# Altium schematic symbol library jlcpcb_2025_04_capacitors_extended_0603.schlib: 3668 symbols (part 14 of 20) (continued)
## EMK107B7473KA-T (continued)

## EMK107B7474KAHT
designator C?  Capacitance: 470nF  (hidden comment: *)
Capacitor, Ceramic (MLCC), 470nF, ±10%, 16V, X7R, ±10%, SMD 0603; Manufacturer: Taiyo Yuden; Manufacturer Part Number: EMK107B7474KAHT; Package Size: 0603; JLCPCB Basic Part: No; JLCPCB Part Number: C385895; Supplier 1: LCSC; Category: Capacitors - MLCC; Supplier Part Number 1: C385895; Tolerance: ±10%; Voltage Rating: 16V; Temperature Coefficient: X7R; RoHS: Yes; ComponentLink1Description: Datasheet; ComponentLink1URL: https://wmsc.lcsc.com/wmsc/upload/file/pdf/v2/lcsc/1912111437_Taiyo-Yuden-EMK107B7474KAHT_C385895.pdf; ComponentLink2Description: JLCPCB Part URL; ComponentLink2URL: https://jlcpcb.com/partdetail/C385895; ComponentLink3Description: LCSC Part URL; ComponentLink3URL: https://lcsc.com/product-detail/Multilayer-Ceramic-Capacitors-MLCC---SMD-SMT_Taiyo-Yuden-Taiyo-Yuden-EMK107B7474KAHT_C385895.html
footprint CAP-0603 (0603 (1608M) Capacitor)
pins: 1, 2

## EMK107BB7225KA-T
designator C?  Capacitance: 2.2uF  (hidden comment: *)
Capacitor, Ceramic (MLCC), 2.2uF, ±10%, 16V, X7R, ±10%, SMD 0603; Manufacturer: Taiyo Yuden; Manufacturer Part Number: EMK107BB7225KA-T; Package Size: 0603; JLCPCB Basic Part: No; JLCPCB Part Number: C337443; Supplier 1: LCSC; Category: Capacitors - MLCC; Supplier Part Number 1: C337443; Tolerance: ±10%; Voltage Rating: 16V; Temperature Coefficient: X7R; RoHS: Yes; ComponentLink1Description: Datasheet; ComponentLink1URL: https://wmsc.lcsc.com/wmsc/upload/file/pdf/v2/lcsc/2304140030_Taiyo-Yuden-EMK107BB7225KA-T_C337443.pdf; ComponentLink2Description: JLCPCB Part URL; ComponentLink2URL: https://jlcpcb.com/partdetail/C337443; ComponentLink3Description: LCSC Part URL; ComponentLink3URL: https://lcsc.com/product-detail/Multilayer-Ceramic-Capacitors-MLCC---SMD-SMT_Taiyo-Yuden-Taiyo-Yuden-EMK107BB7225KA-T_C337443.html
footprint CAP-0603 (0603 (1608M) Capacitor)
pins: 1, 2

## EMK107BBJ475KAHT
designator C?  Capacitance: 4.7uF  (hidden comment: *)
Capacitor, Ceramic (MLCC), 4.7uF, ±10%, 16V, X5R, ±10%, SMD 0603; Manufacturer: Taiyo Yuden; Manufacturer Part Number: EMK107BBJ475KAHT; Package Size: 0603; JLCPCB Basic Part: No; JLCPCB Part Number: C650952; Supplier 1: LCSC; Category: Capacitors - MLCC; Supplier Part Number 1: C650952; Tolerance: ±10%; Voltage Rating: 16V; Temperature Coefficient: X5R; RoHS: Yes; ComponentLink1Description: Datasheet; ComponentLink1URL: https://wmsc.lcsc.com/wmsc/upload/file/pdf/v2/lcsc/2211282200_Taiyo-Yuden-EMK107BBJ475KAHT_C650952.pdf; ComponentLink2Description: JLCPCB Part URL; ComponentLink2URL: https://jlcpcb.com/partdetail/C650952; ComponentLink3Description: LCSC Part URL; ComponentLink3URL: https://lcsc.com/product-detail/Multilayer-Ceramic-Capacitors-MLCC---SMD-SMT_Taiyo-Yuden-Taiyo-Yuden-EMK107BBJ475KAHT_C650952.html
footprint CAP-0603 (0603 (1608M) Capacitor)
pins: 1, 2

## EMK107BJ105KA-T
designator C?  Capacitance: 1uF  (hidden comment: *)
Capacitor, Ceramic (MLCC), 1uF, ±10%, 16V, X5R, ±10%, SMD 0603; Manufacturer: Taiyo Yuden; Manufacturer Part Number: EMK107BJ105KA-T; Package Size: 0603; JLCPCB Basic Part: No; JLCPCB Part Number: C87149; Supplier 1: LCSC; Category: Capacitors - MLCC; Supplier Part Number 1: C87149; Tolerance: ±10%; Voltage Rating: 16V; Temperature Coefficient: X5R; RoHS: Yes; ComponentLink1Description: Datasheet; ComponentLink1URL: https://wmsc.lcsc.com/wmsc/upload/file/pdf/v2/lcsc/2304140030_Taiyo-Yuden-EMK107BJ105KA-T_C87149.pdf; ComponentLink2Description: JLCPCB Part URL; ComponentLink2URL: https://jlcpcb.com/partdetail/C87149; ComponentLink3Description: LCSC Part URL; ComponentLink3URL: https://lcsc.com/product-detail/Multilayer-Ceramic-Capacitors-MLCC---SMD-SMT_Taiyo-Yuden-Taiyo-Yuden-EMK107BJ105KA-T_C87149.html
footprint CAP-0603 (0603 (1608M) Capacitor)
pins: 1, 2

## EMK107BJ225KA-T
designator C?  Capacitance: 2.2uF  (hidden comment: *)
Capacitor, Ceramic (MLCC), 2.2uF, ±10%, 16V, X5R, ±10%, SMD 0603; Manufacturer: Taiyo Yuden; Manufacturer Part Number: EMK107BJ225KA-T; Package Size: 0603; JLCPCB Basic Part: No; JLCPCB Part Number: C92760; Supplier 1: LCSC; Category: Capacitors - MLCC; Supplier Part Number 1: C92760; Tolerance: ±10%; Voltage Rating: 16V; Temperature Coefficient: X5R; RoHS: Yes; ComponentLink1Description: Datasheet; ComponentLink1URL: https://wmsc.lcsc.com/wmsc/upload/file/pdf/v2/lcsc/1810171733_Taiyo-Yuden-EMK107BJ225KA-T_C92760.pdf; ComponentLink2Description: JLCPCB Part URL; ComponentLink2URL: https://jlcpcb.com/partdetail/C92760; ComponentLink3Description: LCSC Part URL; ComponentLink3URL: https://lcsc.com/product-detail/Multilayer-Ceramic-Capacitors-MLCC---SMD-SMT_Taiyo-Yuden-Taiyo-Yuden-EMK107BJ225KA-T_C92760.html
footprint CAP-0603 (0603 (1608M) Capacitor)
pins: 1, 2

## EMK107SD103KA-T
designator C?  Capacitance: 10nF  (hidden comment: *)
Capacitor, Ceramic (MLCC), 10nF, ±10%, 16V, ±10%, SMD 0603; Manufacturer: Taiyo Yuden; Manufacturer Part Number: EMK107SD103KA-T; Package Size: 0603; JLCPCB Basic Part: No; JLCPCB Part Number: C524961; Supplier 1: LCSC; Category: Capacitors - MLCC; Supplier Part Number 1: C524961; Tolerance: ±10%; Voltage Rating: 16V; RoHS: Yes; ComponentLink1Description: Datasheet; ComponentLink1URL: https://wmsc.lcsc.com/wmsc/upload/file/pdf/v2/lcsc/2211282200_Taiyo-Yuden-EMK107SD103KA-T_C524961.pdf; ComponentLink2Description: JLCPCB Part URL; ComponentLink2URL: https://jlcpcb.com/partdetail/C524961; ComponentLink3Description: LCSC Part URL; ComponentLink3URL: https://lcsc.com/product-detail/Multilayer-Ceramic-Capacitors-MLCC---SMD-SMT_Taiyo-Yuden-Taiyo-Yuden-EMK107SD103KA-T_C524961.html
footprint CAP-0603 (0603 (1608M) Capacitor)
pins: 1, 2

## ESD31C103K4T2A-18
designator C?  Capacitance: 10nF  (hidden comment: *)
Capacitor, Ceramic (MLCC), 10nF, ±10%, 100V, X7R, ±10%, SMD 0603; Manufacturer: Kyocera AVX; Manufacturer Part Number: ESD31C103K4T2A-18; Package Size: 0603; JLCPCB Basic Part: No; JLCPCB Part Number: C779983; Supplier 1: LCSC; Category: Capacitors - MLCC; Supplier Part Number 1: C779983; Tolerance: ±10%; Voltage Rating: 100V; Temperature Coefficient: X7R; RoHS: Yes; ComponentLink1Description: Datasheet; ComponentLink1URL: https://wmsc.lcsc.com/wmsc/upload/file/pdf/v2/lcsc/2304140030_Kyocera-AVX-ESD31C103K4T2A-18_C779983.pdf; ComponentLink2Description: JLCPCB Part URL; ComponentLink2URL: https://jlcpcb.com/partdetail/C779983; ComponentLink3Description: LCSC Part URL; ComponentLink3URL: https://lcsc.com/product-detail/Multilayer-Ceramic-Capacitors-MLCC---SMD-SMT_Kyocera-AVX-Kyocera-AVX-ESD31C103K4T2A-18_C779983.html
footprint CAP-0603 (0603 (1608M) Capacitor)
pins: 1, 2

## FCC0603B104K101CT
designator C?  Capacitance: 100000pF  (hidden comment: *)
Capacitor, Ceramic (MLCC), 100000pF, ±10%, 100V, X7R, ±10%, SMD 0603; Manufacturer: FOJAN; Manufacturer Part Number: FCC0603B104K101CT; Package Size: 0603; JLCPCB Basic Part: No; JLCPCB Part Number: C5137616; Supplier 1: LCSC; Category: Capacitors - MLCC; Supplier Part Number 1: C5137616; Tolerance: ±10%; Voltage Rating: 100V; Temperature Coefficient: X7R; RoHS: Yes; ComponentLink1Description: Datasheet; ComponentLink1URL: https://wmsc.lcsc.com/wmsc/upload/file/pdf/v2/lcsc/2208181800_FOJAN-FCC0603B104K101CT_C5137616.pdf; ComponentLink2Description: JLCPCB Part URL; ComponentLink2URL: https://jlcpcb.com/partdetail/C5137616; ComponentLink3Description: LCSC Part URL; ComponentLink3URL: https://lcsc.com/product-detail/Multilayer-Ceramic-Capacitors-MLCC---SMD-SMT_FOJAN-FOJAN-FCC0603B104K101CT_C5137616.html
footprint CAP-0603 (0603 (1608M) Capacitor)
pins: 1, 2

## FCC0603B203K500CT
designator C?  Capacitance: 20nF  (hidden comment: *)
Capacitor, Ceramic (MLCC), 20nF, 50V, X7R, SMD 0603; Manufacturer: FOJAN; Manufacturer Part Number: FCC0603B203K500CT; Package Size: 0603; JLCPCB Basic Part: No; JLCPCB Part Number: C5137632; Supplier 1: LCSC; Category: Capacitors - MLCC; Supplier Part Number 1: C5137632; Voltage Rating: 50V; Temperature Coefficient: X7R; RoHS: Yes; ComponentLink1Description: Datasheet; ComponentLink1URL: https://wmsc.lcsc.com/wmsc/upload/file/pdf/v2/lcsc/2208181800_FOJAN-FCC0603B203K500CT_C5137632.pdf; ComponentLink2Description: JLCPCB Part URL; ComponentLink2URL: https://jlcpcb.com/partdetail/C5137632; ComponentLink3Description: LCSC Part URL; ComponentLink3URL: https://lcsc.com/product-detail/Multilayer-Ceramic-Capacitors-MLCC---SMD-SMT_FOJAN-FOJAN-FCC0603B203K500CT_C5137632.html
footprint CAP-0603 (0603 (1608M) Capacitor)
pins: 1, 2

## FCC0603B224K500CT
designator C?  Capacitance: 220000pF  (hidden comment: *)
Capacitor, Ceramic (MLCC), 220000pF, ±10%, 50V, X7R, ±10%, SMD 0603; Manufacturer: FOJAN; Manufacturer Part Number: FCC0603B224K500CT; Package Size: 0603; JLCPCB Basic Part: No; JLCPCB Part Number: C5137500; Supplier 1: LCSC; Category: Capacitors - MLCC; Supplier Part Number 1: C5137500; Tolerance: ±10%; Voltage Rating: 50V; Temperature Coefficient: X7R; RoHS: Yes; ComponentLink1Description: Datasheet; ComponentLink1URL: https://wmsc.lcsc.com/wmsc/upload/file/pdf/v2/lcsc/2208181800_FOJAN-FCC0603B224K500CT_C5137500.pdf; ComponentLink2Description: JLCPCB Part URL; ComponentLink2URL: https://jlcpcb.com/partdetail/C5137500; ComponentLink3Description: LCSC Part URL; ComponentLink3URL: https://lcsc.com/product-detail/Multilayer-Ceramic-Capacitors-MLCC---SMD-SMT_FOJAN-FOJAN-FCC0603B224K500CT_C5137500.html
footprint CAP-0603 (0603 (1608M) Capacitor)
pins: 1, 2

## FCC0603N221J500CT
designator C?  Capacitance: 220pF  (hidden comment: *)
Capacitor, Ceramic (MLCC), 220pF, ±5%, null, null, ±5%, SMD 0603; Manufacturer: FOJAN; Manufacturer Part Number: FCC0603N221J500CT; Package Size: 0603; JLCPCB Basic Part: No; JLCPCB Part Number: C7467111; Supplier 1: LCSC; Category: Capacitors - MLCC; Supplier Part Number 1: C7467111; Tolerance: ±5%; Voltage Rating: null; Temperature Coefficient: null; RoHS: Yes; ComponentLink1Description: Datasheet; ComponentLink1URL: https://wmsc.lcsc.com/wmsc/upload/file/pdf/v2/lcsc/2308041038_FOJAN-FCC0603N221J500CT_C7467111.pdf; ComponentLink2Description: JLCPCB Part URL; ComponentLink2URL: https://jlcpcb.com/partdetail/C7467111; ComponentLink3Description: LCSC Part URL; ComponentLink3URL: https://lcsc.com/product-detail/Multilayer-Ceramic-Capacitors-MLCC---SMD-SMT_FOJAN-FOJAN-FCC0603N221J500CT_C7467111.html
footprint CAP-0603 (0603 (1608M) Capacitor)
pins: 1, 2

## FCC0603N330J500CT
designator C?  Capacitance: 33pF  (hidden comment: *)
Capacitor, Ceramic (MLCC), 33pF, ±5%, 50V, C0G, ±5%, SMD 0603; Manufacturer: FOJAN; Manufacturer Part Number: FCC0603N330J500CT; Package Size: 0603; JLCPCB Basic Part: No; JLCPCB Part Number: C5137624; Supplier 1: LCSC; Category: Capacitors - MLCC; Supplier Part Number 1: C5137624; Tolerance: ±5%; Voltage Rating: 50V; Temperature Coefficient: C0G; RoHS: Yes; ComponentLink1Description: Datasheet; ComponentLink1URL: https://wmsc.lcsc.com/wmsc/upload/file/pdf/v2/lcsc/2208181800_FOJAN-FCC0603N330J500CT_C5137624.pdf; ComponentLink2Description: JLCPCB Part URL; ComponentLink2URL: https://jlcpcb.com/partdetail/C5137624; ComponentLink3Description: LCSC Part URL; ComponentLink3URL: https://lcsc.com/product-detail/Multilayer-Ceramic-Capacitors-MLCC---SMD-SMT_FOJAN-FOJAN-FCC0603N330J500CT_C5137624.html
footprint CAP-0603 (0603 (1608M) Capacitor)
pins: 1, 2

## FCC0603X106K6R3CT
designator C?  Capacitance: 10uF  (hidden comment: *)
Capacitor, Ceramic (MLCC), 10uF, ±10%, 6.3V, X5R, ±10%, SMD 0603; Manufacturer: FOJAN; Manufacturer Part Number: FCC0603X106K6R3CT; Package Size: 0603; JLCPCB Basic Part: No; JLCPCB Part Number: C5137497; Supplier 1: LCSC; Category: Capacitors - MLCC; Supplier Part Number 1: C5137497; Tolerance: ±10%; Voltage Rating: 6.3V; Temperature Coefficient: X5R; RoHS: Yes; ComponentLink1Description: Datasheet; ComponentLink1URL: https://wmsc.lcsc.com/wmsc/upload/file/pdf/v2/lcsc/2208181800_FOJAN-FCC0603X106K6R3CT_C5137497.pdf; ComponentLink2Description: JLCPCB Part URL; ComponentLink2URL: https://jlcpcb.com/partdetail/C5137497; ComponentLink3Description: LCSC Part URL; ComponentLink3URL: https://lcsc.com/product-detail/Multilayer-Ceramic-Capacitors-MLCC---SMD-SMT_FOJAN-FOJAN-FCC0603X106K6R3CT_C5137497.html
footprint CAP-0603 (0603 (1608M) Capacitor)
pins: 1, 2

## FCC0603X106K100CT
designator C?  Capacitance: 10uF  (hidden comment: *)
Capacitor, Ceramic (MLCC), 10uF, ±10%, 10V, X5R, ±10%, SMD 0603; Manufacturer: FOJAN; Manufacturer Part Number: FCC0603X106K100CT; Package Size: 0603; JLCPCB Basic Part: No; JLCPCB Part Number: C5137565; Supplier 1: LCSC; Category: Capacitors - MLCC; Supplier Part Number 1: C5137565; Tolerance: ±10%; Voltage Rating: 10V; Temperature Coefficient: X5R; RoHS: Yes; ComponentLink1Description: Datasheet; ComponentLink1URL: https://wmsc.lcsc.com/wmsc/upload/file/pdf/v2/lcsc/2208181800_FOJAN-FCC0603X106K100CT_C5137565.pdf; ComponentLink2Description: JLCPCB Part URL; ComponentLink2URL: https://jlcpcb.com/partdetail/C5137565; ComponentLink3Description: LCSC Part URL; ComponentLink3URL: https://lcsc.com/product-detail/Multilayer-Ceramic-Capacitors-MLCC---SMD-SMT_FOJAN-FOJAN-FCC0603X106K100CT_C5137565.html
footprint CAP-0603 (0603 (1608M) Capacitor)
pins: 1, 2

## FCC0603X106M6R3CT
designator C?  Capacitance: 10uF  (hidden comment: *)
Capacitor, Ceramic (MLCC), 10uF, ±20%, 6.3V, X5R, ±20%, SMD 0603; Manufacturer: FOJAN; Manufacturer Part Number: FCC0603X106M6R3CT; Package Size: 0603; JLCPCB Basic Part: No; JLCPCB Part Number: C5137483; Supplier 1: LCSC; Category: Capacitors - MLCC; Supplier Part Number 1: C5137483; Tolerance: ±20%; Voltage Rating: 6.3V; Temperature Coefficient: X5R; RoHS: Yes; ComponentLink1Description: Datasheet; ComponentLink1URL: https://wmsc.lcsc.com/wmsc/upload/file/pdf/v2/lcsc/2208181800_FOJAN-FCC0603X106M6R3CT_C5137483.pdf; ComponentLink2Description: JLCPCB Part URL; ComponentLink2URL: https://jlcpcb.com/partdetail/C5137483; ComponentLink3Description: LCSC Part URL; ComponentLink3URL: https://lcsc.com/product-detail/Multilayer-Ceramic-Capacitors-MLCC---SMD-SMT_FOJAN-FOJAN-FCC0603X106M6R3CT_C5137483.html
footprint CAP-0603 (0603 (1608M) Capacitor)
pins: 1, 2

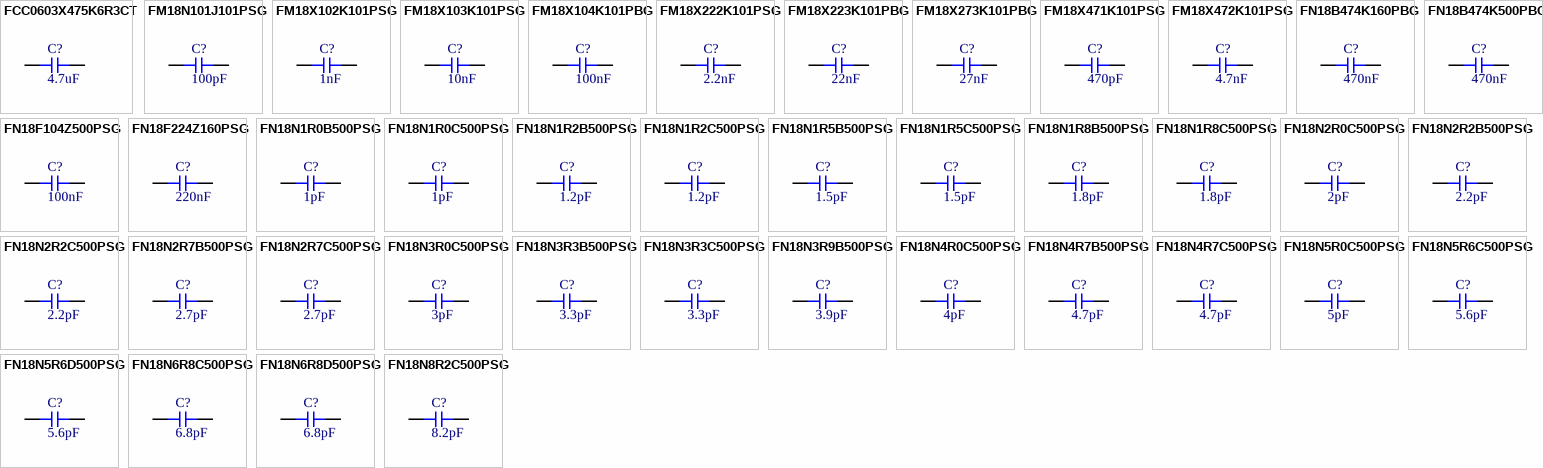
[diagram p63: symbols FCC0603X475K6R3CT to FN18N8R2C500PSG]

## FCC0603X475K6R3CT
designator C?  Capacitance: 4.7uF  (hidden comment: *)
Capacitor, Ceramic (MLCC), 4.7uF, ±10%, 6.3V, X5R, ±10%, SMD 0603; Manufacturer: FOJAN; Manufacturer Part Number: FCC0603X475K6R3CT; Package Size: 0603; JLCPCB Basic Part: No; JLCPCB Part Number: C7419427; Supplier 1: LCSC; Category: Capacitors - MLCC; Supplier Part Number 1: C7419427; Tolerance: ±10%; Voltage Rating: 6.3V; Temperature Coefficient: X5R; RoHS: Yes; ComponentLink1Description: Datasheet; ComponentLink1URL: https://wmsc.lcsc.com/wmsc/upload/file/pdf/v2/lcsc/2404021725_FOJAN-FCC0603X475K6R3CT_C7419427.pdf; ComponentLink2Description: JLCPCB Part URL; ComponentLink2URL: https://jlcpcb.com/partdetail/C7419427; ComponentLink3Description: LCSC Part URL; ComponentLink3URL: https://lcsc.com/product-detail/Multilayer-Ceramic-Capacitors-MLCC---SMD-SMT_FOJAN-FOJAN-FCC0603X475K6R3CT_C7419427.html
footprint CAP-0603 (0603 (1608M) Capacitor)
pins: 1, 2

## FM18N101J101PSG
designator C?  Capacitance: 100pF  (hidden comment: *)
Capacitor, Ceramic (MLCC), 100pF, ±5%, 100V, C0G, ±5%, SMD 0603; Manufacturer: PSA(Prosperity Dielectrics); Manufacturer Part Number: FM18N101J101PSG; Package Size: 0603; JLCPCB Basic Part: No; JLCPCB Part Number: C525173; Supplier 1: LCSC; Category: Capacitors - MLCC; Supplier Part Number 1: C525173; Tolerance: ±5%; Voltage Rating: 100V; Temperature Coefficient: C0G; RoHS: Yes; ComponentLink1Description: Datasheet; ComponentLink1URL: https://wmsc.lcsc.com/wmsc/upload/file/pdf/v2/lcsc/2304140030_PSA-Prosperity-Dielectrics-FM18N101J101PSG_C525173.pdf; ComponentLink2Description: JLCPCB Part URL; ComponentLink2URL: https://jlcpcb.com/partdetail/C525173; ComponentLink3Description: LCSC Part URL; ComponentLink3URL: https://lcsc.com/product-detail/Multilayer-Ceramic-Capacitors-MLCC---SMD-SMT_PSAProsperity-Dielectrics-PSAProsperity-Dielectrics-FM18N101J101PSG_C525173.html
footprint CAP-0603 (0603 (1608M) Capacitor)
pins: 1, 2

## FM18X102K101PSG
designator C?  Capacitance: 1nF  (hidden comment: *)
Capacitor, Ceramic (MLCC), 1nF, ±10%, 100V, X7R, ±10%, SMD 0603; Manufacturer: PSA(Prosperity Dielectrics); Manufacturer Part Number: FM18X102K101PSG; Package Size: 0603; JLCPCB Basic Part: No; JLCPCB Part Number: C363554; Supplier 1: LCSC; Category: Capacitors - MLCC; Supplier Part Number 1: C363554; Tolerance: ±10%; Voltage Rating: 100V; Temperature Coefficient: X7R; RoHS: Yes; ComponentLink1Description: Datasheet; ComponentLink1URL: https://wmsc.lcsc.com/wmsc/upload/file/pdf/v2/lcsc/2304140030_PSA-Prosperity-Dielectrics-FM18X102K101PSG_C363554.pdf; ComponentLink2Description: JLCPCB Part URL; ComponentLink2URL: https://jlcpcb.com/partdetail/C363554; ComponentLink3Description: LCSC Part URL; ComponentLink3URL: https://lcsc.com/product-detail/Multilayer-Ceramic-Capacitors-MLCC---SMD-SMT_PSAProsperity-Dielectrics-PSAProsperity-Dielectrics-FM18X102K101PSG_C363554.html
footprint CAP-0603 (0603 (1608M) Capacitor)
pins: 1, 2

## FM18X103K101PSG
designator C?  Capacitance: 10nF  (hidden comment: *)
Capacitor, Ceramic (MLCC), 10nF, ±10%, 100V, X7R, ±10%, SMD 0603; Manufacturer: PSA(Prosperity Dielectrics); Manufacturer Part Number: FM18X103K101PSG; Package Size: 0603; JLCPCB Basic Part: No; JLCPCB Part Number: C525174; Supplier 1: LCSC; Category: Capacitors - MLCC; Supplier Part Number 1: C525174; Tolerance: ±10%; Voltage Rating: 100V; Temperature Coefficient: X7R; RoHS: Yes; ComponentLink1Description: Datasheet; ComponentLink1URL: https://wmsc.lcsc.com/wmsc/upload/file/pdf/v2/lcsc/2304140030_PSA-Prosperity-Dielectrics-FM18X103K101PSG_C525174.pdf; ComponentLink2Description: JLCPCB Part URL; ComponentLink2URL: https://jlcpcb.com/partdetail/C525174; ComponentLink3Description: LCSC Part URL; ComponentLink3URL: https://lcsc.com/product-detail/Multilayer-Ceramic-Capacitors-MLCC---SMD-SMT_PSAProsperity-Dielectrics-PSAProsperity-Dielectrics-FM18X103K101PSG_C525174.html
footprint CAP-0603 (0603 (1608M) Capacitor)
pins: 1, 2

## FM18X104K101PBG
designator C?  Capacitance: 100nF  (hidden comment: *)
Capacitor, Ceramic (MLCC), 100nF, ±10%, 100V, X7R, ±10%, SMD 0603; Manufacturer: PSA(Prosperity Dielectrics); Manufacturer Part Number: FM18X104K101PBG; Package Size: 0603; JLCPCB Basic Part: No; JLCPCB Part Number: C525175; Supplier 1: LCSC; Category: Capacitors - MLCC; Supplier Part Number 1: C525175; Tolerance: ±10%; Voltage Rating: 100V; Temperature Coefficient: X7R; RoHS: Yes; ComponentLink1Description: Datasheet; ComponentLink1URL: https://wmsc.lcsc.com/wmsc/upload/file/pdf/v2/lcsc/2304140030_PSA-Prosperity-Dielectrics-FM18X104K101PBG_C525175.pdf; ComponentLink2Description: JLCPCB Part URL; ComponentLink2URL: https://jlcpcb.com/partdetail/C525175; ComponentLink3Description: LCSC Part URL; ComponentLink3URL: https://lcsc.com/product-detail/Multilayer-Ceramic-Capacitors-MLCC---SMD-SMT_PSAProsperity-Dielectrics-PSAProsperity-Dielectrics-FM18X104K101PBG_C525175.html
footprint CAP-0603 (0603 (1608M) Capacitor)
pins: 1, 2

## FM18X222K101PSG
designator C?  Capacitance: 2.2nF  (hidden comment: *)
Capacitor, Ceramic (MLCC), 2.2nF, ±10%, 100V, X7R, ±10%, SMD 0603; Manufacturer: PSA(Prosperity Dielectrics); Manufacturer Part Number: FM18X222K101PSG; Package Size: 0603; JLCPCB Basic Part: No; JLCPCB Part Number: C382253; Supplier 1: LCSC; Category: Capacitors - MLCC; Supplier Part Number 1: C382253; Tolerance: ±10%; Voltage Rating: 100V; Temperature Coefficient: X7R; RoHS: Yes; ComponentLink1Description: Datasheet; ComponentLink1URL: https://wmsc.lcsc.com/wmsc/upload/file/pdf/v2/lcsc/2304140030_PSA-Prosperity-Dielectrics-FM18X222K101PSG_C382253.pdf; ComponentLink2Description: JLCPCB Part URL; ComponentLink2URL: https://jlcpcb.com/partdetail/C382253; ComponentLink3Description: LCSC Part URL; ComponentLink3URL: https://lcsc.com/product-detail/Multilayer-Ceramic-Capacitors-MLCC---SMD-SMT_PSAProsperity-Dielectrics-PSAProsperity-Dielectrics-FM18X222K101PSG_C382253.html
footprint CAP-0603 (0603 (1608M) Capacitor)
pins: 1, 2

## FM18X223K101PBG
designator C?  Capacitance: 22nF  (hidden comment: *)
Capacitor, Ceramic (MLCC), 22nF, ±10%, 100V, X7R, ±10%, SMD 0603; Manufacturer: PSA(Prosperity Dielectrics); Manufacturer Part Number: FM18X223K101PBG; Package Size: 0603; JLCPCB Basic Part: No; JLCPCB Part Number: C525176; Supplier 1: LCSC; Category: Capacitors - MLCC; Supplier Part Number 1: C525176; Tolerance: ±10%; Voltage Rating: 100V; Temperature Coefficient: X7R; RoHS: Yes; ComponentLink1Description: Datasheet; ComponentLink1URL: https://wmsc.lcsc.com/wmsc/upload/file/pdf/v2/lcsc/2304140030_PSA-Prosperity-Dielectrics-FM18X223K101PBG_C525176.pdf; ComponentLink2Description: JLCPCB Part URL; ComponentLink2URL: https://jlcpcb.com/partdetail/C525176; ComponentLink3Description: LCSC Part URL; ComponentLink3URL: https://lcsc.com/product-detail/Multilayer-Ceramic-Capacitors-MLCC---SMD-SMT_PSAProsperity-Dielectrics-PSAProsperity-Dielectrics-FM18X223K101PBG_C525176.html
footprint CAP-0603 (0603 (1608M) Capacitor)
pins: 1, 2

## FM18X273K101PBG
designator C?  Capacitance: 27nF  (hidden comment: *)
Capacitor, Ceramic (MLCC), 27nF, ±10%, 100V, X7R, ±10%, SMD 0603; Manufacturer: PSA(Prosperity Dielectrics); Manufacturer Part Number: FM18X273K101PBG; Package Size: 0603; JLCPCB Basic Part: No; JLCPCB Part Number: C525177; Supplier 1: LCSC; Category: Capacitors - MLCC; Supplier Part Number 1: C525177; Tolerance: ±10%; Voltage Rating: 100V; Temperature Coefficient: X7R; RoHS: Yes; ComponentLink1Description: Datasheet; ComponentLink1URL: https://wmsc.lcsc.com/wmsc/upload/file/pdf/v2/lcsc/2304140030_PSA-Prosperity-Dielectrics-FM18X273K101PBG_C525177.pdf; ComponentLink2Description: JLCPCB Part URL; ComponentLink2URL: https://jlcpcb.com/partdetail/C525177; ComponentLink3Description: LCSC Part URL; ComponentLink3URL: https://lcsc.com/product-detail/Multilayer-Ceramic-Capacitors-MLCC---SMD-SMT_PSAProsperity-Dielectrics-PSAProsperity-Dielectrics-FM18X273K101PBG_C525177.html
footprint CAP-0603 (0603 (1608M) Capacitor)
pins: 1, 2

## FM18X471K101PSG
designator C?  Capacitance: 470pF  (hidden comment: *)
Capacitor, Ceramic (MLCC), 470pF, ±10%, 100V, X7R, ±10%, SMD 0603; Manufacturer: PSA(Prosperity Dielectrics); Manufacturer Part Number: FM18X471K101PSG; Package Size: 0603; JLCPCB Basic Part: No; JLCPCB Part Number: C382252; Supplier 1: LCSC; Category: Capacitors - MLCC; Supplier Part Number 1: C382252; Tolerance: ±10%; Voltage Rating: 100V; Temperature Coefficient: X7R; RoHS: Yes; ComponentLink1Description: Datasheet; ComponentLink1URL: https://wmsc.lcsc.com/wmsc/upload/file/pdf/v2/lcsc/2304140030_PSA-Prosperity-Dielectrics-FM18X471K101PSG_C382252.pdf; ComponentLink2Description: JLCPCB Part URL; ComponentLink2URL: https://jlcpcb.com/partdetail/C382252; ComponentLink3Description: LCSC Part URL; ComponentLink3URL: https://lcsc.com/product-detail/Multilayer-Ceramic-Capacitors-MLCC---SMD-SMT_PSAProsperity-Dielectrics-PSAProsperity-Dielectrics-FM18X471K101PSG_C382252.html
footprint CAP-0603 (0603 (1608M) Capacitor)
pins: 1, 2

## FM18X472K101PSG
designator C?  Capacitance: 4.7nF  (hidden comment: *)
Capacitor, Ceramic (MLCC), 4.7nF, ±10%, 100V, X7R, ±10%, SMD 0603; Manufacturer: PSA(Prosperity Dielectrics); Manufacturer Part Number: FM18X472K101PSG; Package Size: 0603; JLCPCB Basic Part: No; JLCPCB Part Number: C382251; Supplier 1: LCSC; Category: Capacitors - MLCC; Supplier Part Number 1: C382251; Tolerance: ±10%; Voltage Rating: 100V; Temperature Coefficient: X7R; RoHS: Yes; ComponentLink1Description: Datasheet; ComponentLink1URL: https://wmsc.lcsc.com/wmsc/upload/file/pdf/v2/lcsc/2304140030_PSA-Prosperity-Dielectrics-FM18X472K101PSG_C382251.pdf; ComponentLink2Description: JLCPCB Part URL; ComponentLink2URL: https://jlcpcb.com/partdetail/C382251; ComponentLink3Description: LCSC Part URL; ComponentLink3URL: https://lcsc.com/product-detail/Multilayer-Ceramic-Capacitors-MLCC---SMD-SMT_PSAProsperity-Dielectrics-PSAProsperity-Dielectrics-FM18X472K101PSG_C382251.html
footprint CAP-0603 (0603 (1608M) Capacitor)
pins: 1, 2

## FN18B474K160PBG
designator C?  Capacitance: 470nF  (hidden comment: *)
Capacitor, Ceramic (MLCC), 470nF, ±10%, 16V, X5R, ±10%, SMD 0603; Manufacturer: PSA(Prosperity Dielectrics); Manufacturer Part Number: FN18B474K160PBG; Package Size: 0603; JLCPCB Basic Part: No; JLCPCB Part Number: C525233; Supplier 1: LCSC; Category: Capacitors - MLCC; Supplier Part Number 1: C525233; Tolerance: ±10%; Voltage Rating: 16V; Temperature Coefficient: X5R; RoHS: Yes; ComponentLink1Description: Datasheet; ComponentLink1URL: https://wmsc.lcsc.com/wmsc/upload/file/pdf/v2/lcsc/2304140030_PSA-Prosperity-Dielectrics-FN18B474K160PBG_C525233.pdf; ComponentLink2Description: JLCPCB Part URL; ComponentLink2URL: https://jlcpcb.com/partdetail/C525233; ComponentLink3Description: LCSC Part URL; ComponentLink3URL: https://lcsc.com/product-detail/Multilayer-Ceramic-Capacitors-MLCC---SMD-SMT_PSAProsperity-Dielectrics-PSAProsperity-Dielectrics-FN18B474K160PBG_C525233.html
footprint CAP-0603 (0603 (1608M) Capacitor)
pins: 1, 2

## FN18B474K500PBG
designator C?  Capacitance: 470nF  (hidden comment: *)
Capacitor, Ceramic (MLCC), 470nF, ±10%, 50V, X5R, ±10%, SMD 0603; Manufacturer: PSA(Prosperity Dielectrics); Manufacturer Part Number: FN18B474K500PBG; Package Size: 0603; JLCPCB Basic Part: No; JLCPCB Part Number: C525234; Supplier 1: LCSC; Category: Capacitors - MLCC; Supplier Part Number 1: C525234; Tolerance: ±10%; Voltage Rating: 50V; Temperature Coefficient: X5R; RoHS: Yes; ComponentLink1Description: Datasheet; ComponentLink1URL: https://wmsc.lcsc.com/wmsc/upload/file/pdf/v2/lcsc/2304140030_PSA-Prosperity-Dielectrics-FN18B474K500PBG_C525234.pdf; ComponentLink2Description: JLCPCB Part URL; ComponentLink2URL: https://jlcpcb.com/partdetail/C525234; ComponentLink3Description: LCSC Part URL; ComponentLink3URL: https://lcsc.com/product-detail/Multilayer-Ceramic-Capacitors-MLCC---SMD-SMT_PSAProsperity-Dielectrics-PSAProsperity-Dielectrics-FN18B474K500PBG_C525234.html
footprint CAP-0603 (0603 (1608M) Capacitor)
pins: 1, 2

## FN18F104Z500PSG
designator C?  Capacitance: 100nF  (hidden comment: *)
Capacitor, Ceramic (MLCC), 100nF, 50V, Y5V, SMD 0603; Manufacturer: PSA(Prosperity Dielectrics); Manufacturer Part Number: FN18F104Z500PSG; Temperature Rating: -20%~+80%; Package Size: 0603; JLCPCB Basic Part: No; JLCPCB Part Number: C497032; Supplier 1: LCSC; Category: Capacitors - MLCC; Supplier Part Number 1: C497032; Voltage Rating: 50V; Temperature Coefficient: Y5V; RoHS: Yes; ComponentLink1Description: Datasheet; ComponentLink1URL: https://wmsc.lcsc.com/wmsc/upload/file/pdf/v2/lcsc/2005211034_PSA-Prosperity-Dielectrics-FN18F104Z500PSG_C497032.pdf; ComponentLink2Description: JLCPCB Part URL; ComponentLink2URL: https://jlcpcb.com/partdetail/C497032; ComponentLink3Description: LCSC Part URL; ComponentLink3URL: https://lcsc.com/product-detail/Multilayer-Ceramic-Capacitors-MLCC---SMD-SMT_PSAProsperity-Dielectrics-PSAProsperity-Dielectrics-FN18F104Z500PSG_C497032.html
footprint CAP-0603 (0603 (1608M) Capacitor)
pins: 1, 2

## FN18F224Z160PSG
designator C?  Capacitance: 220nF  (hidden comment: *)
Capacitor, Ceramic (MLCC), 220nF, 16V, Y5V, SMD 0603; Manufacturer: PSA(Prosperity Dielectrics); Manufacturer Part Number: FN18F224Z160PSG; Temperature Rating: -20%~+80%; Package Size: 0603; JLCPCB Basic Part: No; JLCPCB Part Number: C363561; Supplier 1: LCSC; Category: Capacitors - MLCC; Supplier Part Number 1: C363561; Voltage Rating: 16V; Temperature Coefficient: Y5V; RoHS: Yes; ComponentLink1Description: Datasheet; ComponentLink1URL: https://wmsc.lcsc.com/wmsc/upload/file/pdf/v2/lcsc/2304140030_PSA-Prosperity-Dielectrics-FN18F224Z160PSG_C363561.pdf; ComponentLink2Description: JLCPCB Part URL; ComponentLink2URL: https://jlcpcb.com/partdetail/C363561; ComponentLink3Description: LCSC Part URL; ComponentLink3URL: https://lcsc.com/product-detail/Multilayer-Ceramic-Capacitors-MLCC---SMD-SMT_PSAProsperity-Dielectrics-PSAProsperity-Dielectrics-FN18F224Z160PSG_C363561.html
footprint CAP-0603 (0603 (1608M) Capacitor)
pins: 1, 2

## FN18N1R0B500PSG
designator C?  Capacitance: 1pF  (hidden comment: *)
Capacitor, Ceramic (MLCC), 1pF, 50V, NP0, SMD 0603; Manufacturer: PSA(Prosperity Dielectrics); Manufacturer Part Number: FN18N1R0B500PSG; Package Size: 0603; JLCPCB Basic Part: No; JLCPCB Part Number: C565608; Supplier 1: LCSC; Category: Capacitors - MLCC; Supplier Part Number 1: C565608; Voltage Rating: 50V; Temperature Coefficient: NP0; RoHS: Yes; ComponentLink1Description: Datasheet; ComponentLink1URL: https://wmsc.lcsc.com/wmsc/upload/file/pdf/v2/lcsc/2304140030_PSA-Prosperity-Dielectrics-FN18N1R0B500PSG_C565608.pdf; ComponentLink2Description: JLCPCB Part URL; ComponentLink2URL: https://jlcpcb.com/partdetail/C565608; ComponentLink3Description: LCSC Part URL; ComponentLink3URL: https://lcsc.com/product-detail/Multilayer-Ceramic-Capacitors-MLCC---SMD-SMT_PSAProsperity-Dielectrics-PSAProsperity-Dielectrics-FN18N1R0B500PSG_C565608.html
footprint CAP-0603 (0603 (1608M) Capacitor)
pins: 1, 2

## FN18N1R0C500PSG
designator C?  Capacitance: 1pF  (hidden comment: *)
Capacitor, Ceramic (MLCC), 1pF, 50V, C0G, SMD 0603; Manufacturer: PSA(Prosperity Dielectrics); Manufacturer Part Number: FN18N1R0C500PSG; Package Size: 0603; JLCPCB Basic Part: No; JLCPCB Part Number: C525240; Supplier 1: LCSC; Category: Capacitors - MLCC; Supplier Part Number 1: C525240; Voltage Rating: 50V; Temperature Coefficient: C0G; RoHS: Yes; ComponentLink1Description: Datasheet; ComponentLink1URL: https://wmsc.lcsc.com/wmsc/upload/file/pdf/v2/lcsc/2304140030_PSA-Prosperity-Dielectrics-FN18N1R0C500PSG_C525240.pdf; ComponentLink2Description: JLCPCB Part URL; ComponentLink2URL: https://jlcpcb.com/partdetail/C525240; ComponentLink3Description: LCSC Part URL; ComponentLink3URL: https://lcsc.com/product-detail/Multilayer-Ceramic-Capacitors-MLCC---SMD-SMT_PSAProsperity-Dielectrics-PSAProsperity-Dielectrics-FN18N1R0C500PSG_C525240.html
footprint CAP-0603 (0603 (1608M) Capacitor)
pins: 1, 2

## FN18N1R2B500PSG
designator C?  Capacitance: 1.2pF  (hidden comment: *)
Capacitor, Ceramic (MLCC), 1.2pF, 50V, SMD 0603; Manufacturer: PSA(Prosperity Dielectrics); Manufacturer Part Number: FN18N1R2B500PSG; Package Size: 0603; JLCPCB Basic Part: No; JLCPCB Part Number: C363548; Supplier 1: LCSC; Category: Capacitors - MLCC; Supplier Part Number 1: C363548; Voltage Rating: 50V; RoHS: Yes; ComponentLink1Description: Datasheet; ComponentLink1URL: https://wmsc.lcsc.com/wmsc/upload/file/pdf/v2/lcsc/2011061135_PSA-Prosperity-Dielectrics-FN18N1R2B500PSG_C363548.pdf; ComponentLink2Description: JLCPCB Part URL; ComponentLink2URL: https://jlcpcb.com/partdetail/C363548; ComponentLink3Description: LCSC Part URL; ComponentLink3URL: https://lcsc.com/product-detail/Multilayer-Ceramic-Capacitors-MLCC---SMD-SMT_PSAProsperity-Dielectrics-PSAProsperity-Dielectrics-FN18N1R2B500PSG_C363548.html
footprint CAP-0603 (0603 (1608M) Capacitor)
pins: 1, 2

## FN18N1R2C500PSG
designator C?  Capacitance: 1.2pF  (hidden comment: *)
Capacitor, Ceramic (MLCC), 1.2pF, 50V, SMD 0603; Manufacturer: PSA(Prosperity Dielectrics); Manufacturer Part Number: FN18N1R2C500PSG; Package Size: 0603; JLCPCB Basic Part: No; JLCPCB Part Number: C565566; Supplier 1: LCSC; Category: Capacitors - MLCC; Supplier Part Number 1: C565566; Voltage Rating: 50V; RoHS: Yes; ComponentLink1Description: Datasheet; ComponentLink1URL: https://wmsc.lcsc.com/wmsc/upload/file/pdf/v2/lcsc/2304140030_PSA-Prosperity-Dielectrics-FN18N1R2C500PSG_C565566.pdf; ComponentLink2Description: JLCPCB Part URL; ComponentLink2URL: https://jlcpcb.com/partdetail/C565566; ComponentLink3Description: LCSC Part URL; ComponentLink3URL: https://lcsc.com/product-detail/Multilayer-Ceramic-Capacitors-MLCC---SMD-SMT_PSAProsperity-Dielectrics-PSAProsperity-Dielectrics-FN18N1R2C500PSG_C565566.html
footprint CAP-0603 (0603 (1608M) Capacitor)
pins: 1, 2

## FN18N1R5B500PSG
designator C?  Capacitance: 1.5pF  (hidden comment: *)
Capacitor, Ceramic (MLCC), 1.5pF, 50V, NP0, SMD 0603; Manufacturer: PSA(Prosperity Dielectrics); Manufacturer Part Number: FN18N1R5B500PSG; Package Size: 0603; JLCPCB Basic Part: No; JLCPCB Part Number: C565609; Supplier 1: LCSC; Category: Capacitors - MLCC; Supplier Part Number 1: C565609; Voltage Rating: 50V; Temperature Coefficient: NP0; RoHS: Yes; ComponentLink1Description: Datasheet; ComponentLink1URL: https://wmsc.lcsc.com/wmsc/upload/file/pdf/v2/lcsc/2304140030_PSA-Prosperity-Dielectrics-FN18N1R5B500PSG_C565609.pdf; ComponentLink2Description: JLCPCB Part URL; ComponentLink2URL: https://jlcpcb.com/partdetail/C565609; ComponentLink3Description: LCSC Part URL; ComponentLink3URL: https://lcsc.com/product-detail/Multilayer-Ceramic-Capacitors-MLCC---SMD-SMT_PSAProsperity-Dielectrics-PSAProsperity-Dielectrics-FN18N1R5B500PSG_C565609.html
footprint CAP-0603 (0603 (1608M) Capacitor)
pins: 1, 2

## FN18N1R5C500PSG
designator C?  Capacitance: 1.5pF  (hidden comment: *)
Capacitor, Ceramic (MLCC), 1.5pF, 50V, C0G, SMD 0603; Manufacturer: PSA(Prosperity Dielectrics); Manufacturer Part Number: FN18N1R5C500PSG; Package Size: 0603; JLCPCB Basic Part: No; JLCPCB Part Number: C525241; Supplier 1: LCSC; Category: Capacitors - MLCC; Supplier Part Number 1: C525241; Voltage Rating: 50V; Temperature Coefficient: C0G; RoHS: Yes; ComponentLink1Description: Datasheet; ComponentLink1URL: https://wmsc.lcsc.com/wmsc/upload/file/pdf/v2/lcsc/2304140030_PSA-Prosperity-Dielectrics-FN18N1R5C500PSG_C525241.pdf; ComponentLink2Description: JLCPCB Part URL; ComponentLink2URL: https://jlcpcb.com/partdetail/C525241; ComponentLink3Description: LCSC Part URL; ComponentLink3URL: https://lcsc.com/product-detail/Multilayer-Ceramic-Capacitors-MLCC---SMD-SMT_PSAProsperity-Dielectrics-PSAProsperity-Dielectrics-FN18N1R5C500PSG_C525241.html
footprint CAP-0603 (0603 (1608M) Capacitor)
pins: 1, 2

## FN18N1R8B500PSG
designator C?  Capacitance: 1.8pF  (hidden comment: *)
Capacitor, Ceramic (MLCC), 1.8pF, 50V, NP0, SMD 0603; Manufacturer: PSA(Prosperity Dielectrics); Manufacturer Part Number: FN18N1R8B500PSG; Package Size: 0603; JLCPCB Basic Part: No; JLCPCB Part Number: C565610; Supplier 1: LCSC; Category: Capacitors - MLCC; Supplier Part Number 1: C565610; Voltage Rating: 50V; Temperature Coefficient: NP0; RoHS: Yes; ComponentLink1Description: Datasheet; ComponentLink1URL: https://wmsc.lcsc.com/wmsc/upload/file/pdf/v2/lcsc/2304140030_PSA-Prosperity-Dielectrics-FN18N1R8B500PSG_C565610.pdf; ComponentLink2Description: JLCPCB Part URL; ComponentLink2URL: https://jlcpcb.com/partdetail/C565610; ComponentLink3Description: LCSC Part URL; ComponentLink3URL: https://lcsc.com/product-detail/Multilayer-Ceramic-Capacitors-MLCC---SMD-SMT_PSAProsperity-Dielectrics-PSAProsperity-Dielectrics-FN18N1R8B500PSG_C565610.html
footprint CAP-0603 (0603 (1608M) Capacitor)
pins: 1, 2

## FN18N1R8C500PSG
designator C?  Capacitance: 1.8pF  (hidden comment: *)
Capacitor, Ceramic (MLCC), 1.8pF, 50V, C0G, SMD 0603; Manufacturer: PSA(Prosperity Dielectrics); Manufacturer Part Number: FN18N1R8C500PSG; Package Size: 0603; JLCPCB Basic Part: No; JLCPCB Part Number: C525242; Supplier 1: LCSC; Category: Capacitors - MLCC; Supplier Part Number 1: C525242; Voltage Rating: 50V; Temperature Coefficient: C0G; RoHS: Yes; ComponentLink1Description: Datasheet; ComponentLink1URL: https://wmsc.lcsc.com/wmsc/upload/file/pdf/v2/lcsc/2304140030_PSA-Prosperity-Dielectrics-FN18N1R8C500PSG_C525242.pdf; ComponentLink2Description: JLCPCB Part URL; ComponentLink2URL: https://jlcpcb.com/partdetail/C525242; ComponentLink3Description: LCSC Part URL; ComponentLink3URL: https://lcsc.com/product-detail/Multilayer-Ceramic-Capacitors-MLCC---SMD-SMT_PSAProsperity-Dielectrics-PSAProsperity-Dielectrics-FN18N1R8C500PSG_C525242.html
footprint CAP-0603 (0603 (1608M) Capacitor)
pins: 1, 2

## FN18N2R0C500PSG
designator C?  Capacitance: 2pF  (hidden comment: *)
Capacitor, Ceramic (MLCC), 2pF, 50V, C0G, SMD 0603; Manufacturer: PSA(Prosperity Dielectrics); Manufacturer Part Number: FN18N2R0C500PSG; Package Size: 0603; JLCPCB Basic Part: No; JLCPCB Part Number: C363549; Supplier 1: LCSC; Category: Capacitors - MLCC; Supplier Part Number 1: C363549; Voltage Rating: 50V; Temperature Coefficient: C0G; RoHS: Yes; ComponentLink1Description: Datasheet; ComponentLink1URL: https://wmsc.lcsc.com/wmsc/upload/file/pdf/v2/lcsc/2304140030_PSA-Prosperity-Dielectrics-FN18N2R0C500PSG_C363549.pdf; ComponentLink2Description: JLCPCB Part URL; ComponentLink2URL: https://jlcpcb.com/partdetail/C363549; ComponentLink3Description: LCSC Part URL; ComponentLink3URL: https://lcsc.com/product-detail/Multilayer-Ceramic-Capacitors-MLCC---SMD-SMT_PSAProsperity-Dielectrics-PSAProsperity-Dielectrics-FN18N2R0C500PSG_C363549.html
footprint CAP-0603 (0603 (1608M) Capacitor)
pins: 1, 2

## FN18N2R2B500PSG
designator C?  Capacitance: 2.2pF  (hidden comment: *)
Capacitor, Ceramic (MLCC), 2.2pF, 50V, C0G, SMD 0603; Manufacturer: PSA(Prosperity Dielectrics); Manufacturer Part Number: FN18N2R2B500PSG; Package Size: 0603; JLCPCB Basic Part: No; JLCPCB Part Number: C565611; Supplier 1: LCSC; Category: Capacitors - MLCC; Supplier Part Number 1: C565611; Voltage Rating: 50V; Temperature Coefficient: C0G; RoHS: Yes; ComponentLink1Description: Datasheet; ComponentLink1URL: https://wmsc.lcsc.com/wmsc/upload/file/pdf/v2/lcsc/2304140030_PSA-Prosperity-Dielectrics-FN18N2R2B500PSG_C565611.pdf; ComponentLink2Description: JLCPCB Part URL; ComponentLink2URL: https://jlcpcb.com/partdetail/C565611; ComponentLink3Description: LCSC Part URL; ComponentLink3URL: https://lcsc.com/product-detail/Multilayer-Ceramic-Capacitors-MLCC---SMD-SMT_PSAProsperity-Dielectrics-PSAProsperity-Dielectrics-FN18N2R2B500PSG_C565611.html
footprint CAP-0603 (0603 (1608M) Capacitor)
pins: 1, 2

## FN18N2R2C500PSG
designator C?  Capacitance: 2.2pF  (hidden comment: *)
Capacitor, Ceramic (MLCC), 2.2pF, 50V, NP0, SMD 0603; Manufacturer: PSA(Prosperity Dielectrics); Manufacturer Part Number: FN18N2R2C500PSG; Package Size: 0603; JLCPCB Basic Part: No; JLCPCB Part Number: C525248; Supplier 1: LCSC; Category: Capacitors - MLCC; Supplier Part Number 1: C525248; Voltage Rating: 50V; Temperature Coefficient: NP0; RoHS: Yes; ComponentLink1Description: Datasheet; ComponentLink1URL: https://wmsc.lcsc.com/wmsc/upload/file/pdf/v2/lcsc/2304140030_PSA-Prosperity-Dielectrics-FN18N2R2C500PSG_C525248.pdf; ComponentLink2Description: JLCPCB Part URL; ComponentLink2URL: https://jlcpcb.com/partdetail/C525248; ComponentLink3Description: LCSC Part URL; ComponentLink3URL: https://lcsc.com/product-detail/Multilayer-Ceramic-Capacitors-MLCC---SMD-SMT_PSAProsperity-Dielectrics-PSAProsperity-Dielectrics-FN18N2R2C500PSG_C525248.html
footprint CAP-0603 (0603 (1608M) Capacitor)
pins: 1, 2

## FN18N2R7B500PSG
designator C?  Capacitance: 2.7pF  (hidden comment: *)
Capacitor, Ceramic (MLCC), 2.7pF, 50V, C0G, SMD 0603; Manufacturer: PSA(Prosperity Dielectrics); Manufacturer Part Number: FN18N2R7B500PSG; Package Size: 0603; JLCPCB Basic Part: No; JLCPCB Part Number: C565612; Supplier 1: LCSC; Category: Capacitors - MLCC; Supplier Part Number 1: C565612; Voltage Rating: 50V; Temperature Coefficient: C0G; RoHS: Yes; ComponentLink1Description: Datasheet; ComponentLink1URL: https://wmsc.lcsc.com/wmsc/upload/file/pdf/v2/lcsc/2304140030_PSA-Prosperity-Dielectrics-FN18N2R7B500PSG_C565612.pdf; ComponentLink2Description: JLCPCB Part URL; ComponentLink2URL: https://jlcpcb.com/partdetail/C565612; ComponentLink3Description: LCSC Part URL; ComponentLink3URL: https://lcsc.com/product-detail/Multilayer-Ceramic-Capacitors-MLCC---SMD-SMT_PSAProsperity-Dielectrics-PSAProsperity-Dielectrics-FN18N2R7B500PSG_C565612.html
footprint CAP-0603 (0603 (1608M) Capacitor)
pins: 1, 2

## FN18N2R7C500PSG
designator C?  Capacitance: 2.7pF  (hidden comment: *)
Capacitor, Ceramic (MLCC), 2.7pF, 50V, NP0, SMD 0603; Manufacturer: PSA(Prosperity Dielectrics); Manufacturer Part Number: FN18N2R7C500PSG; Package Size: 0603; JLCPCB Basic Part: No; JLCPCB Part Number: C525249; Supplier 1: LCSC; Category: Capacitors - MLCC; Supplier Part Number 1: C525249; Voltage Rating: 50V; Temperature Coefficient: NP0; RoHS: Yes; ComponentLink1Description: Datasheet; ComponentLink1URL: https://wmsc.lcsc.com/wmsc/upload/file/pdf/v2/lcsc/2304140030_PSA-Prosperity-Dielectrics-FN18N2R7C500PSG_C525249.pdf; ComponentLink2Description: JLCPCB Part URL; ComponentLink2URL: https://jlcpcb.com/partdetail/C525249; ComponentLink3Description: LCSC Part URL; ComponentLink3URL: https://lcsc.com/product-detail/Multilayer-Ceramic-Capacitors-MLCC---SMD-SMT_PSAProsperity-Dielectrics-PSAProsperity-Dielectrics-FN18N2R7C500PSG_C525249.html
footprint CAP-0603 (0603 (1608M) Capacitor)
pins: 1, 2

## FN18N3R0C500PSG
designator C?  Capacitance: 3pF  (hidden comment: *)
Capacitor, Ceramic (MLCC), 3pF, 50V, C0G, SMD 0603; Manufacturer: PSA(Prosperity Dielectrics); Manufacturer Part Number: FN18N3R0C500PSG; Package Size: 0603; JLCPCB Basic Part: No; JLCPCB Part Number: C2929152; Supplier 1: LCSC; Category: Capacitors - MLCC; Supplier Part Number 1: C2929152; Voltage Rating: 50V; Temperature Coefficient: C0G; RoHS: Yes; ComponentLink1Description: Datasheet; ComponentLink1URL: https://wmsc.lcsc.com/wmsc/upload/file/pdf/v2/lcsc/2201121400_PSA-Prosperity-Dielectrics-FN18N3R0C500PSG_C2929152.pdf; ComponentLink2Description: JLCPCB Part URL; ComponentLink2URL: https://jlcpcb.com/partdetail/C2929152; ComponentLink3Description: LCSC Part URL; ComponentLink3URL: https://lcsc.com/product-detail/Multilayer-Ceramic-Capacitors-MLCC---SMD-SMT_PSAProsperity-Dielectrics-PSAProsperity-Dielectrics-FN18N3R0C500PSG_C2929152.html
footprint CAP-0603 (0603 (1608M) Capacitor)
pins: 1, 2

## FN18N3R3B500PSG
designator C?  Capacitance: 3.3pF  (hidden comment: *)
Capacitor, Ceramic (MLCC), 3.3pF, 50V, NP0, SMD 0603; Manufacturer: PSA(Prosperity Dielectrics); Manufacturer Part Number: FN18N3R3B500PSG; Package Size: 0603; JLCPCB Basic Part: No; JLCPCB Part Number: C565613; Supplier 1: LCSC; Category: Capacitors - MLCC; Supplier Part Number 1: C565613; Voltage Rating: 50V; Temperature Coefficient: NP0; RoHS: Yes; ComponentLink1Description: Datasheet; ComponentLink1URL: https://wmsc.lcsc.com/wmsc/upload/file/pdf/v2/lcsc/2304140030_PSA-Prosperity-Dielectrics-FN18N3R3B500PSG_C565613.pdf; ComponentLink2Description: JLCPCB Part URL; ComponentLink2URL: https://jlcpcb.com/partdetail/C565613; ComponentLink3Description: LCSC Part URL; ComponentLink3URL: https://lcsc.com/product-detail/Multilayer-Ceramic-Capacitors-MLCC---SMD-SMT_PSAProsperity-Dielectrics-PSAProsperity-Dielectrics-FN18N3R3B500PSG_C565613.html
footprint CAP-0603 (0603 (1608M) Capacitor)
pins: 1, 2

## FN18N3R3C500PSG
designator C?  Capacitance: 3.3pF  (hidden comment: *)
Capacitor, Ceramic (MLCC), 3.3pF, 50V, C0G, SMD 0603; Manufacturer: PSA(Prosperity Dielectrics); Manufacturer Part Number: FN18N3R3C500PSG; Package Size: 0603; JLCPCB Basic Part: No; JLCPCB Part Number: C525251; Supplier 1: LCSC; Category: Capacitors - MLCC; Supplier Part Number 1: C525251; Voltage Rating: 50V; Temperature Coefficient: C0G; RoHS: Yes; ComponentLink1Description: Datasheet; ComponentLink1URL: https://wmsc.lcsc.com/wmsc/upload/file/pdf/v2/lcsc/2304140030_PSA-Prosperity-Dielectrics-FN18N3R3C500PSG_C525251.pdf; ComponentLink2Description: JLCPCB Part URL; ComponentLink2URL: https://jlcpcb.com/partdetail/C525251; ComponentLink3Description: LCSC Part URL; ComponentLink3URL: https://lcsc.com/product-detail/Multilayer-Ceramic-Capacitors-MLCC---SMD-SMT_PSAProsperity-Dielectrics-PSAProsperity-Dielectrics-FN18N3R3C500PSG_C525251.html
footprint CAP-0603 (0603 (1608M) Capacitor)
pins: 1, 2

## FN18N3R9B500PSG
designator C?  Capacitance: 3.9pF  (hidden comment: *)
Capacitor, Ceramic (MLCC), 3.9pF, 50V, C0G, SMD 0603; Manufacturer: PSA(Prosperity Dielectrics); Manufacturer Part Number: FN18N3R9B500PSG; Package Size: 0603; JLCPCB Basic Part: No; JLCPCB Part Number: C565614; Supplier 1: LCSC; Category: Capacitors - MLCC; Supplier Part Number 1: C565614; Voltage Rating: 50V; Temperature Coefficient: C0G; RoHS: Yes; ComponentLink1Description: Datasheet; ComponentLink1URL: https://wmsc.lcsc.com/wmsc/upload/file/pdf/v2/lcsc/2304140030_PSA-Prosperity-Dielectrics-FN18N3R9B500PSG_C565614.pdf; ComponentLink2Description: JLCPCB Part URL; ComponentLink2URL: https://jlcpcb.com/partdetail/C565614; ComponentLink3Description: LCSC Part URL; ComponentLink3URL: https://lcsc.com/product-detail/Multilayer-Ceramic-Capacitors-MLCC---SMD-SMT_PSAProsperity-Dielectrics-PSAProsperity-Dielectrics-FN18N3R9B500PSG_C565614.html
footprint CAP-0603 (0603 (1608M) Capacitor)
pins: 1, 2

## FN18N4R0C500PSG
designator C?  Capacitance: 4pF  (hidden comment: *)
Capacitor, Ceramic (MLCC), 4pF, 50V, C0G, SMD 0603; Manufacturer: PSA(Prosperity Dielectrics); Manufacturer Part Number: FN18N4R0C500PSG; Package Size: 0603; JLCPCB Basic Part: No; JLCPCB Part Number: C2847430; Supplier 1: LCSC; Category: Capacitors - MLCC; Supplier Part Number 1: C2847430; Voltage Rating: 50V; Temperature Coefficient: C0G; RoHS: Yes; ComponentLink1Description: Datasheet; ComponentLink1URL: https://wmsc.lcsc.com/wmsc/upload/file/pdf/v2/lcsc/2108142130_PSA-Prosperity-Dielectrics-FN18N4R0C500PSG_C2847430.pdf; ComponentLink2Description: JLCPCB Part URL; ComponentLink2URL: https://jlcpcb.com/partdetail/C2847430; ComponentLink3Description: LCSC Part URL; ComponentLink3URL: https://lcsc.com/product-detail/Multilayer-Ceramic-Capacitors-MLCC---SMD-SMT_PSAProsperity-Dielectrics-PSAProsperity-Dielectrics-FN18N4R0C500PSG_C2847430.html
footprint CAP-0603 (0603 (1608M) Capacitor)
pins: 1, 2
